# Altium footprint library RGBandGestureSensors.PcbLib: 43 footprints (part 1 of 3)
Each footprint in its own frame and in the unit in brackets; x right, y up, seen from the top. Pads: shape width x height; smd on the part's side, far side on the other; paste and mask are expansions set on the pad; w line width, h text height; cw(c..) or ccw(c..) is an arc to the next point about the centre after c.
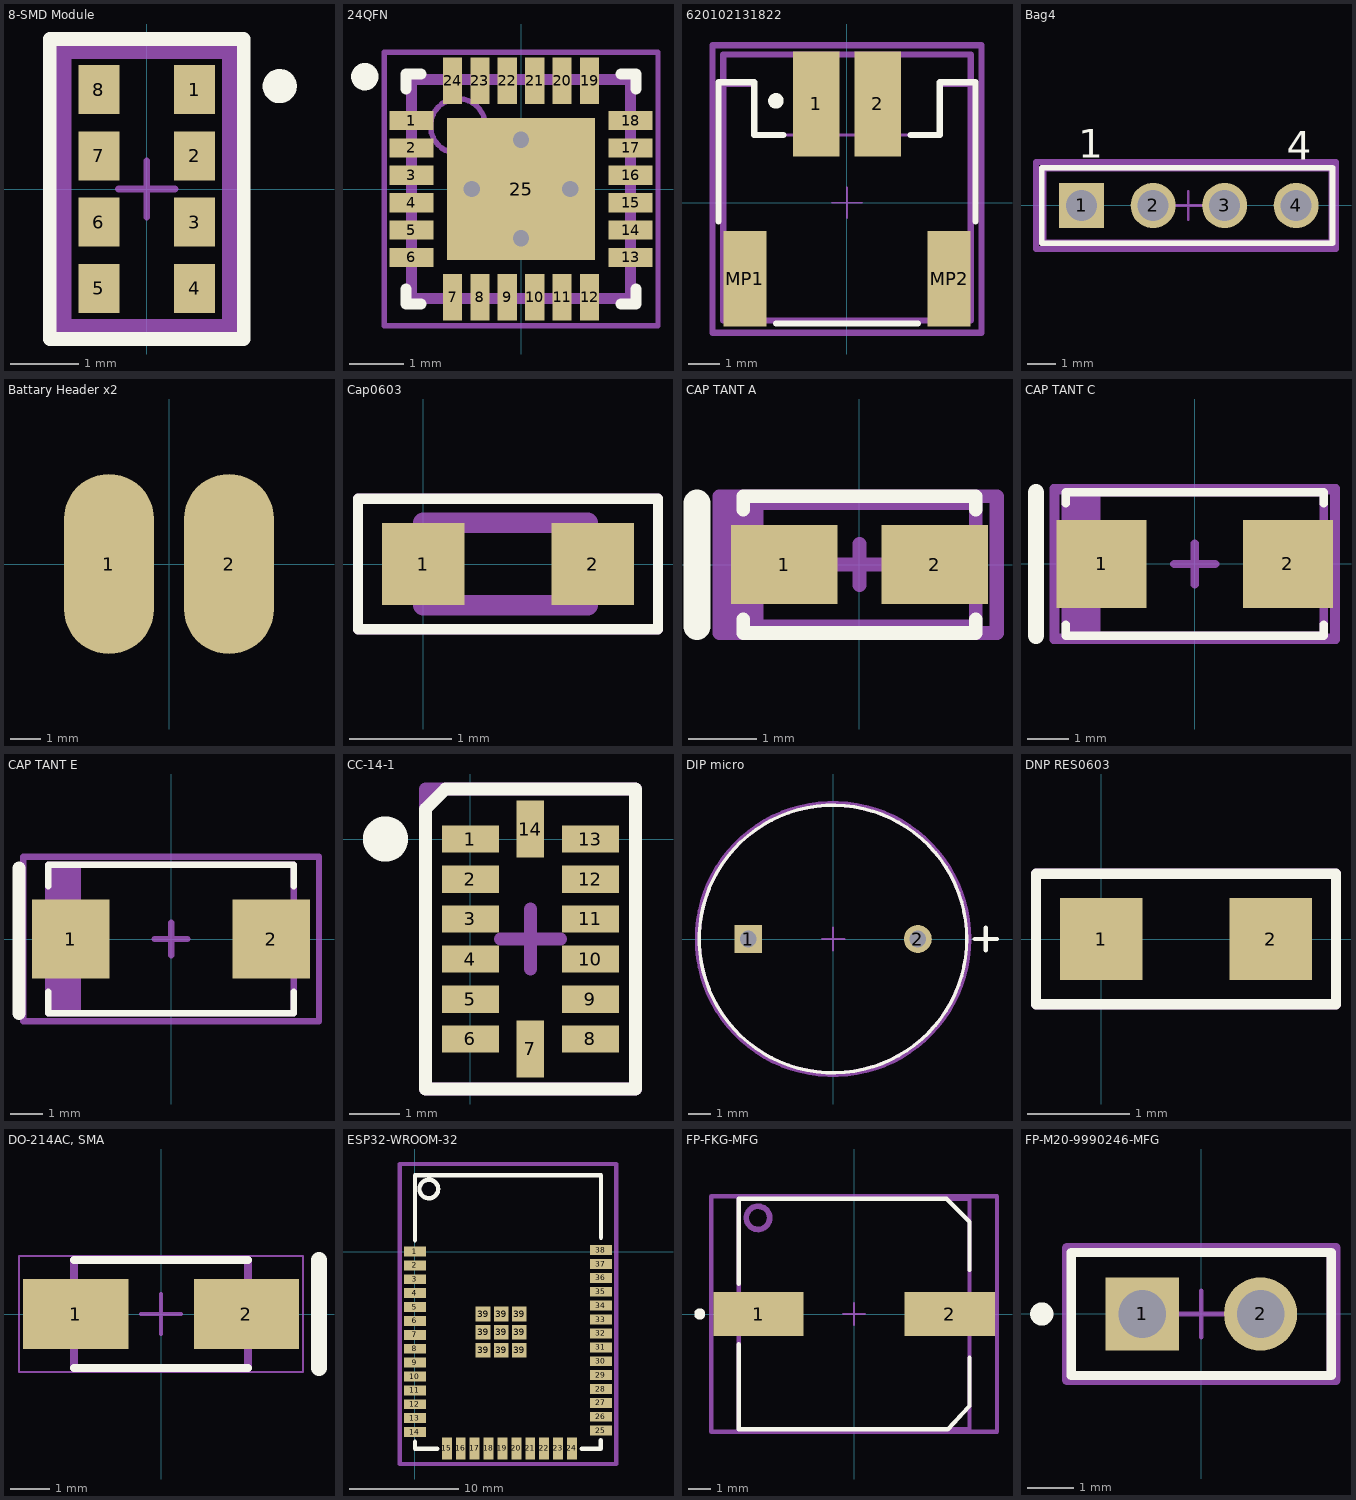
[diagram p0: the footprints below, top view; thin cyan lines are the x and y axes]

## 8-SMD Module [mm]
pads (8):
  rect 0.6x0.72 smd paste+0 mask+0: 1(0.7,1.455) 2(0.7,0.485) 3(0.7,-0.485) 4(0.7,-1.455) 5(-0.7,-1.455) 6(-0.7,-0.485) 7(-0.7,0.485) 8(-0.7,1.455)
Top Overlay:
  circle w0.25: c1.945,1.505 r0.125
  lines w0.2: -1.42,-2.195 -1.42,2.195 1.42,2.195 1.42,-2.195 -1.42,-2.195
Mechanical 1:
  lines w0.2: -1.28,-2.07 -1.28,2.07 1.28,2.07 1.28,-2.07 -1.28,-2.07
Top Assembly:
  lines w0.2: -1.38,-2.17 1.38,-2.17 1.38,2.17 -1.38,2.17 -1.38,-2.17
3D:
  lines w0.2: -1.2,-2 1.2,-2 1.2,2 -1.2,2 -1.2,-2
Mechanical 15:
  lines w0.1: -0.414,0 0.414,0 ; 0,-0.414 0,0.414
  lines w0.2: -1.38,-2.17 -1.38,2.17 1.38,2.17 1.38,-2.17 -1.38,-2.17
3D body "IC_Broadcom_APDS-9960_eec.STEP": height 1.35, standoff 0, extent -1.18,-1.97 1.18,1.97

## 24QFN [mm]
pads (25):
  rect 0.8x0.35 smd: 1(-2,1.25) 2(-2,0.75) 3(-2,0.25) 4(-2,-0.25) 5(-2,-0.75) 6(-2,-1.25) 13(2,-1.25) 14(2,-0.75) 15(2,-0.25) 16(2,0.25) 17(2,0.75) 18(2,1.25)
  rect 0.35x0.85 smd: 7(-1.25,-1.975) 8(-0.75,-1.975) 9(-0.25,-1.975) 10(0.25,-1.975) 11(0.75,-1.975) 12(1.25,-1.975) 19(1.25,1.975) 20(0.75,1.975) 21(0.25,1.975) 22(-0.25,1.975) 23(-0.75,1.975) 24(-1.25,1.975)
  rect 2.7x2.6 smd: 25(0,0)
via 0,-0.9 diameter 0.6 hole 0.3
via 0.9,0 diameter 0.6 hole 0.3
via -0.9,0 diameter 0.6 hole 0.3
via 0,0.9 diameter 0.6 hole 0.3
Top Overlay:
  circle w0.25: c-2.85,2.05 r0.125
  lines w0.2: -2.1,-1.825 -2.1,-2.1 -1.825,-2.1 ; -2.1,1.825 -2.1,2.1 -1.825,2.1 ; 1.825,-2.1 2.1,-2.1 2.1,-1.825 ; 1.825,2.1 2.1,2.1 2.1,1.825
Top Assembly:
  lines w0.2: -2,-2 2,-2 2,2 -2,2 -2,-2
3D:
  lines w0.2: -2,-2 2,-2 2,2 -2,2 -2,-2
Mechanical 13:
  circle w0.1: c-1.15,1.15 r0.5
Mechanical 15:
  lines w0.1: -0.5,0 0.5,0 ; 0,-0.5 0,0.5 ; -2.5,-2.5 -2.5,2.5 2.5,2.5 2.5,-2.5 -2.5,-2.5
3D body "User Library-mpu-6050_qfn-24-1.STEP": height 0.88, standoff -0.02, extent -2,-2.02 2.04,2.02

## 620102131822 [mm]
pads (4):
  rect 1.5x3.4 smd: 1(-1,3.2) 2(1,3.2)
  rect 1.4x3.1 smd: MP1(-3.3,-2.45) MP2(3.3,-2.45)
Top Overlay:
  circle w0.25: c-2.3,3.3 r0.125
  lines w0.2: -4.15,-0.6 -4.15,3.9 -3,3.9 -3,2.2 -2.05,2.2 ; -2.3,-3.9 2.3,-3.9 ; 2.05,2.2 3,2.2 3,3.9 4.15,3.9 4.15,-0.6
Top Assembly:
  lines w0.1: -4,-3.8 4,-3.8 4,3.8 3,3.8 3,2.2 -3,2.2 -3,3.8 -4,3.8 -4,-3.8
3D:
  lines w0.2: -4,-3.8 4,-3.8 4,4.8 -4,4.8 -4,-3.8
Mechanical 15:
  lines w0.05: -0.5,0 0.5,0 ; 0,-0.5 0,0.5
  lines w0.2: -4.35,-4.2 4.35,-4.2 4.35,5.1 -4.35,5.1 -4.35,-4.2
3D body "620102131822.stp": height 5.57, standoff -0.01, extent -4,-3.8 4,4.8

## Bag4 [mm]
pads (4):
  rect 1.6x1.6 hole 1.1: 1(-10.16,0)
  round 1.6 hole 1.1: 2(-7.62,0) 3(-5.08,0) 4(-2.54,0)
Top Overlay:
  lines w0.2: -11.58,-1.345 -1.25,-1.345 -1.25,1.345 -11.58,1.345 -11.58,-1.345
  text "1" at -10.28,1.7 h1.02
  text "4" at -2.875,1.625 h1.02
Top Assembly:
  lines w0.1: -11.625,-1.27 -11.625,1.27 -1.25,1.27 -1.25,-1.27 -11.625,-1.27
3D:
  lines w0.2: -11.5,-1.3 -1.3,-1.3 -1.3,1.3 -11.5,1.3 -11.5,-1.3
Mechanical 15:
  lines w0.1: -6.875,0 -5.875,0 ; -6.375,-0.5 -6.375,0.5
  lines w0.2: -11.78,-1.545 -11.78,1.545 -1.125,1.545 -1.125,-1.545 -11.78,-1.545
3D body "Conn_Harwin_M20-9990246_eec.STEP": height 8.99, standoff -2.94, extent -11.415,-1.271 -6.335,1.27
3D body "Conn_Harwin_M20-9990246_eec.STEP": height 8.99, standoff -2.94, extent -6.415,-1.271 -1.335,1.27

## Battary Header x2 [mm]
pads (2):
  oval 3x6 smd: 1(-2,0) 2(2,0)

## Cap0603 [mm]
pads (2):
  rect 0.8x0.8 smd: 1(0,0) 2(1.651,0)
Top Overlay:
  lines w0.1: -0.635,-0.635 -0.635,0.635 2.286,0.635 2.286,-0.635 -0.635,-0.635
Top Assembly:
  lines w0.1: -0.635,-0.635 -0.635,0.635 2.286,0.635 2.286,-0.635 -0.635,-0.635
3D:
  lines w0.2: 0,-0.4 1.6,-0.4 1.6,0.4 0,0.4 0,-0.4
3D body "User Library-CapCeramic_Kemet_0603_1608.STEP": height 0.8, standoff 0, extent -0.038,-0.4 1.562,0.4

## CAP TANT A [mm]
pads (2):
  rect 1.55x1.15 smd: 1(-1.1,0) 2(1.1,0)
Top Overlay:
  lines w0.2: -1.7,-0.8 -1.7,-1 1.7,-1 1.7,-0.8 ; -1.7,0.8 -1.7,1 1.7,1 1.7,0.8
  lines w0.4: -2.375,-0.9 -2.375,0.9
Top Assembly:
  rectangle: -2.007,-1 -1.4,1.016
  lines w0.2: -2,-1 -2,1 2,1 2,-1 -2,-1
3D:
  lines w0.2: -1.7,-0.9 1.7,-0.9 1.7,0.9 -1.7,0.9 -1.7,-0.9
Mechanical 15:
  lines w0.2: -0.3,0 0.3,0 ; 0,-0.3 0,0.3 ; -2.049,-1 2.01,-1 2.01,1 -2.049,1 -2.049,-1
3D body "t494a105k020at.stp": height 1.81, standoff 0.01, extent -1.7,-0.9 1.7,0.9

## CAP TANT C [mm] "CAP TANT C"
pads (2):
  rect 2.2x2.15 smd: 1(-2.275,0) 2(2.275,0)
Top Overlay:
  lines w0.2: -3.15,-1.475 -3.15,-1.75 3.15,-1.75 3.15,-1.475 ; -3.15,1.475 -3.15,1.75 3.15,1.75 3.15,1.475
  lines w0.4: -3.875,-1.75 -3.875,1.75
Top Assembly:
  rectangle: -3.15,-1.75 -2.303,1.75
  lines w0.2: -3.15,-1.75 -3.15,1.75 3.15,1.75 3.15,-1.75 -3.15,-1.75
3D:
  lines w0.2: -3.4,-1.8 -3.4,1.8 3.4,1.8 3.4,-1.8 -3.4,-1.8
Mechanical 15:
  lines w0.2: -0.5,0 0.5,0 ; 0,-0.5 0,0.5 ; -3.45,-1.85 3.45,-1.85 3.45,1.85 -3.45,1.85 -3.45,-1.85
3D body "CAPMP6032X28L.step": height 2.8, standoff 0, extent -3.37,-1.75 3.37,1.75

## CAP TANT E [mm] "Molded Capacitor, 2-Leads, Body 7,45x4,45mm, IPC Medium Density"
height 4
pads (2):
  rect 2.4x2.45 smd: 1(-3.1,0) 2(3.1,0)
Top Overlay:
  lines w0.2: -3.8,-1.625 -3.8,-2.3 3.8,-2.3 3.8,-1.625 ; -3.8,1.625 -3.8,2.3 3.8,2.3 3.8,1.625
  lines w0.4: -4.7,-2.3 -4.7,2.2
Top Assembly:
  rectangle: -3.8,-2.3 -2.778,2.3
  lines w0.2: -3.8,-2.3 3.8,-2.3 3.8,2.3 -3.8,2.3 -3.8,-2.3
Mechanical 15:
  lines w0.2: -0.5,0 0.5,0 ; 0,-0.5 0,0.5 ; -4.575,-2.55 4.575,-2.55 4.575,2.55 -4.575,2.55 -4.575,-2.55
3D body "CAP TANT E.step": height 4, standoff 0, extent -4.02,-2.3 4.02,2.3

## CC-14-1 [mm]
pads (14):
  rect 1.145x0.55 smd: 1(0,0) 2(0,-0.8) 3(0,-1.6) 4(0,-2.4) 5(0,-3.2) 6(0,-4) 8(2.4,-4) 9(2.4,-3.2) 10(2.4,-2.4) 11(2.4,-1.6) 12(2.4,-0.8) 13(2.4,0)
  rect 0.55x1.145 smd: 7(1.2,-4.2) 14(1.2,0.2)
Top Overlay:
  circle w0.7: c-1.7,0 r0.1
  lines w0.254: -0.9,-5 3.3,-5 3.3,1 -0.5,1 -0.9,0.6 -0.9,-5
Top Assembly:
  lines w0.254: -0.9,-5 3.3,-5 3.3,1 -0.9,1 -0.9,-5
Mechanical 15:
  lines w0.254: 0.6,-2 1.8,-2 ; 1.2,-2.6 1.2,-1.4 ; -0.9,-5 3.3,-5 3.3,1 -0.9,1 -0.9,-5
3D body "User Library-ADXL345.STEP": height 1, standoff 0, extent -0.3,-4.5 2.7,0.5

## DIP micro [mm]
pads (2):
  rect 1.25x1.25 hole 0.75 paste-1000 mask+0: 1(-3.8,0)
  round 1.25 hole 0.75 paste-1000 mask+0: 2(3.8,0)
Top Overlay:
  circle w0.15: c0,0 r6
  lines w0.2: 6.35,0 7.35,0 ; 6.85,-0.5 6.85,0.5
Top Assembly:
  lines w0.2: -6.1,0 cw(c0,0) 6.1,0 cw(c0,0) -6.1,0
Mechanical 13:
  circle w0.15: c0,0 r6
Mechanical 16:
  lines w0.1: -0.5,0 0.5,0 ; 0,-0.5 0,0.5
3D body "Speak_Multicomp_Pro_MCKPX-G1203A-K4056_eec.STEP": height 9.5, standoff -4, extent -6,-6 6.396,6

## DNP RES0603 [mm]
pads (2):
  rect 0.8x0.8 smd: 1(0,0) 2(1.65,0)
Top Overlay:
  lines w0.1: -0.635,-0.635 -0.635,0.635 2.286,0.635 2.286,-0.635 -0.635,-0.635
Top Assembly:
  lines w0.1: -0.635,-0.635 -0.635,0.635 2.286,0.635 2.286,-0.635 -0.635,-0.635

## DO-214AC, SMA [mm]
pads (2):
  rect 2.65x1.75 smd: 1(-2.15,0) 2(2.15,0)
Top Overlay:
  lines w0.2: -2.187,-1.362 2.187,-1.362 ; -2.187,1.362 2.187,1.362
  lines w0.4: 3.975,-1.362 3.975,1.362
Top Assembly:
  lines w0.2: -2.187,-1.362 -2.187,1.362 2.187,1.362 2.187,-1.362 -2.187,-1.362
Mechanical 15:
  lines w0.05: -3.575,-1.462 3.575,-1.462 3.575,1.462 -3.575,1.462 -3.575,-1.462
  lines w0.1: -0.5,0 0.5,0 ; 0,-0.5 0,0.5
3D body "User Library-DO-214AC SMA.STEP": height 2.3, standoff -0.1, extent -2.6,-1.3 2.6,1.3

## ESP32-WROOM-32 [mm]
pads (47):
  rect 2x0.9 smd: 1(0,0) 2(0,-1.27) 3(0,-2.54) 4(0,-3.81) 5(0,-5.08) 6(0,-6.35) 7(0,-7.62) 8(0,-8.89) 9(0,-10.16) 10(0,-11.43) 11(0,-12.7) 12(0,-13.97) 13(0,-15.24) 14(0,-16.51) 25(17,-16.383) 26(17,-15.113) 27(17,-13.843) 28(17,-12.573) 29(17,-11.303) 30(17,-10.033) 31(17,-8.763) 32(17,-7.493) 33(17,-6.223) 34(17,-4.953) 35(17,-3.683) 36(17,-2.413) 37(17,-1.143) 38(17,0.127)
  rect 0.9x2 smd: 15(2.921,-18) 16(4.191,-18) 17(5.461,-18) 18(6.731,-18) 19(8.001,-18) 20(9.271,-18) 21(10.541,-18) 22(11.811,-18) 23(13.081,-18) 24(14.351,-18)
  rect 1.33x1.33 smd: 39(6.223,-9.017) 39(6.223,-7.366) 39(6.223,-5.715) 39(7.874,-9.017) 39(7.874,-7.366) 39(7.874,-5.715) 39(9.525,-9.017) 39(9.525,-7.366) 39(9.525,-5.715)
Top Overlay:
  circle w0.4: c1.27,5.715 r0.852
  lines w0.4: 0,-17.399 0,-18.034 2.032,-18.034 ; 0,1.016 0,6.985 17.018,6.985 17.018,1.27 ; 15.24,-18.034 16.976,-18.034 16.976,-17.272
Top Assembly:
  lines w0.4: -1.397,-19.431 18.415,-19.431 18.415,8.001 -1.397,8.001 -1.397,-19.431
3D body "ESP32-WROOM.STEP": height 2.91, standoff -0.01, extent -0.364,-17.907 17.636,7.593

## FP-FKG-MFG [mm]
pads (2):
  rect 4.1x2 smd paste+0 mask+0: 1(-4.35,0) 2(4.35,0)
Top Overlay:
  circle w0.25: c-7.025,0 r0.125
  lines w0.2: -5.25,-5.25 -5.25,-1.375 ; -5.25,1.375 -5.25,5.25 4.2,5.25 ; -5.242,-5.251 4.208,-5.251 ; 4.225,5.225 5.225,4.225 ; 4.254,-5.25 5.224,-4.21 ; 5.25,2 5.25,4.2 ; 5.251,-4.184 5.251,-1.984
Top Assembly:
  circle w0.254: c-4.375,4.375 r0.53
  lines w0.2: -5.25,-5.25 -5.25,5.25 5.25,5.25 5.25,-5.25 -5.25,-5.25
Board:
  lines w0.2: -6.5,-5.35 6.5,-5.35 6.5,5.35 -6.5,5.35 -6.5,-5.35
Mechanical 15:
  lines w0.2: -6.5,-5.35 6.5,-5.35 6.5,5.35 -6.5,5.35 -6.5,-5.35
Mechanical 16:
  lines w0.1: -0.5,0 0.5,0 ; 0,-0.5 0,0.5
3D body "Cap_Panasonic_EEEFK1H221P_eec.STEP": height 10.5, standoff 0, extent -6,-5.15 6,5.15

## FP-M20-9990246-MFG [mm]
pads (2):
  rect 1.57x1.57 hole 1.02 paste-1000 mask+0: 1(-1.27,0)
  round 1.57 hole 1.02 paste-1000 mask+0: 2(1.27,0)
Top Overlay:
  circle w0.25: c-3.425,0 r0.125
  lines w0.2: -2.79,-1.32 2.79,-1.32 2.79,1.32 -2.79,1.32 -2.79,-1.32
Top Assembly:
  lines w0.2: -2.79,-1.32 -2.79,1.32 2.79,1.32 2.79,-1.32 -2.79,-1.32
Mechanical 13:
  lines w0.1: -0.5,0 0.5,0 ; 0,-0.5 0,0.5
Mechanical 15:
  lines w0.2: -2.89,-1.42 2.89,-1.42 2.89,1.42 -2.89,1.42 -2.89,-1.42
3D body "Conn_Harwin_M20-9990246_eec.STEP": height 8.99, standoff -2.94, extent -2.54,-1.271 2.54,1.27